# Altium footprint library LUMI_Handy_Soldering_LIB.PcbLib: 562 footprints (part 23 of 36)
Each footprint in its own frame and in the unit in brackets; x right, y up, seen from the top. Pads: shape width x height; smd on the part's side, far side on the other; paste and mask are expansions set on the pad; w line width, h text height; cw(c..) or ccw(c..) is an arc to the next point about the centre after c.
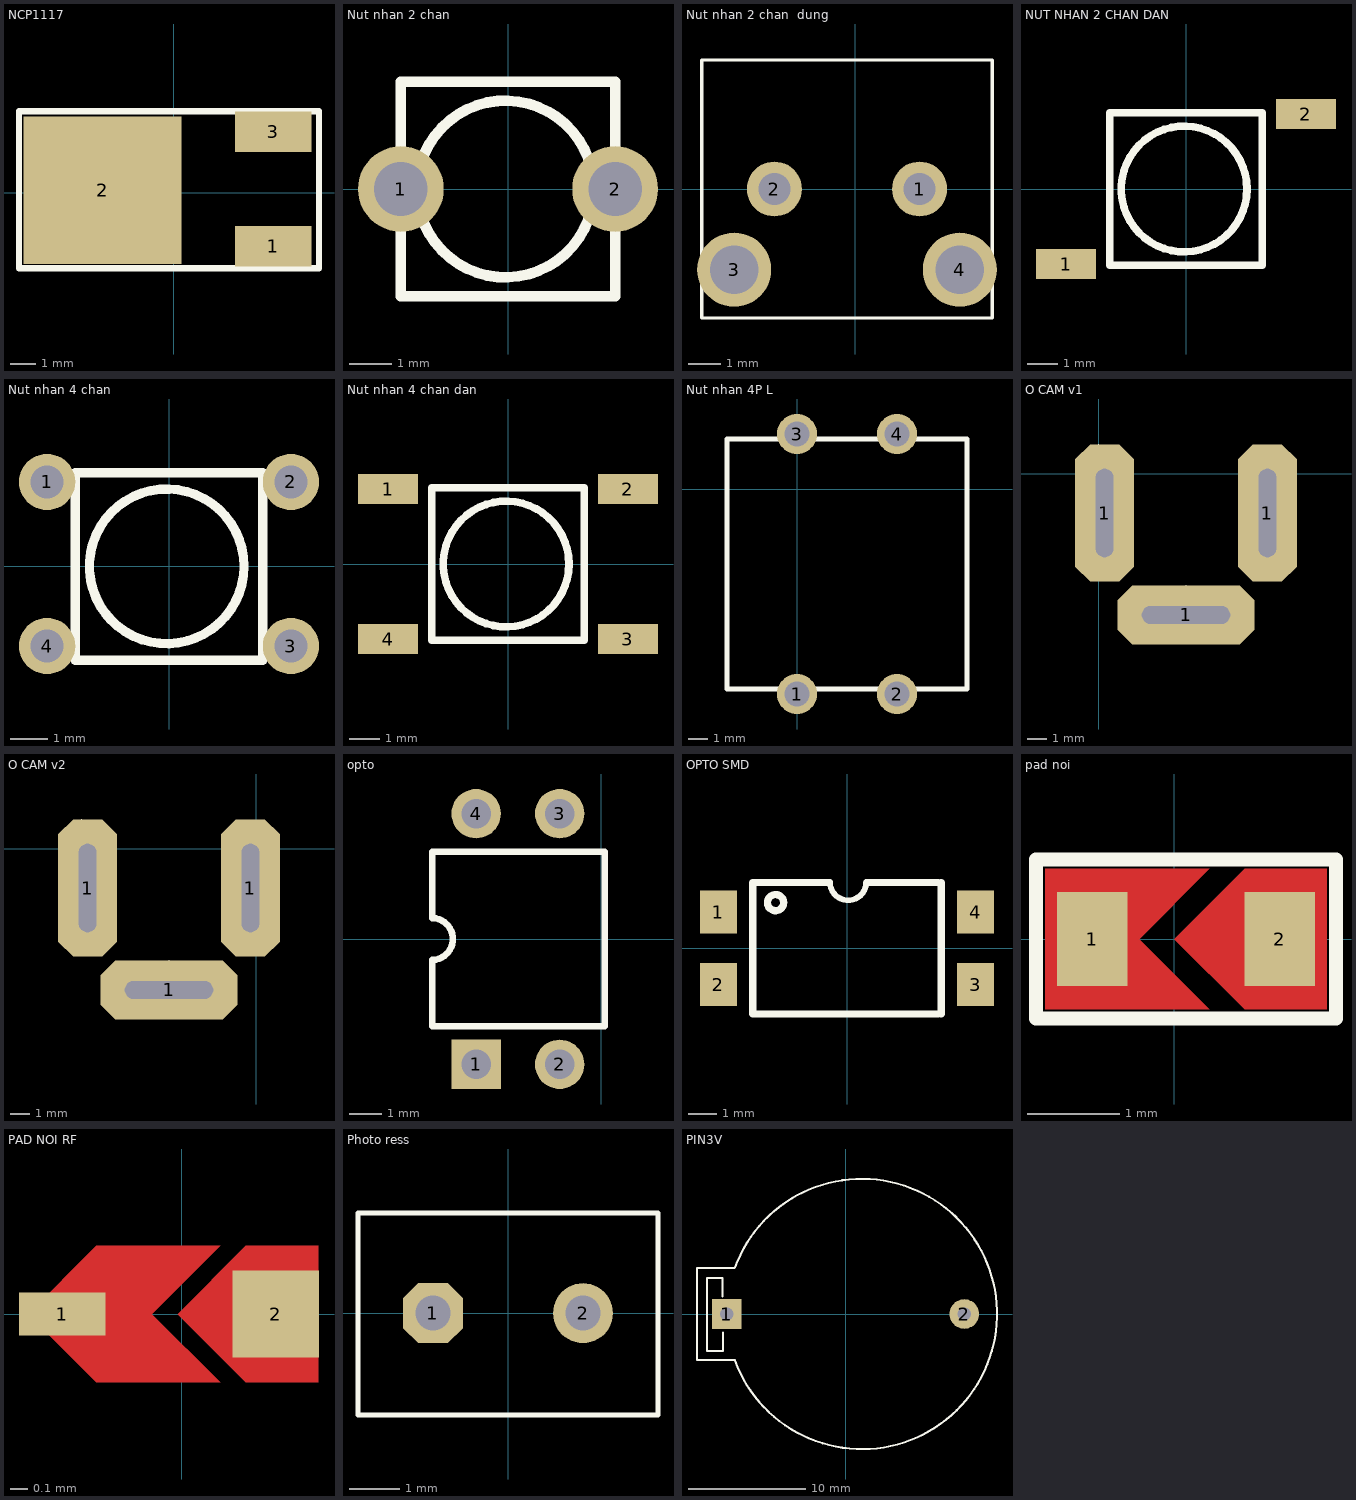
[diagram p22: the footprints below, top view; thin cyan lines are the x and y axes]

## NCP1117 [mm]
pads (3):
  rect 3x1.6 smd: 1(3.9,-2.1) 3(3.9,2.4)
  rect 6.2x5.8 smd: 2(-2.8,0.1)
Top Overlay:
  lines w0.254: -6.08,-2.97 -6.08,3.2 5.7,3.2 5.7,-2.97 -6.08,-2.97
3D body: height 2.3, standoff -0.01, extent -4.75,-3.2 4.95,3.38

## Nut nhan 2 chan [mil]
pads (2):
  round 80 hole 50: 1(-100,0) 2(100,0)
Top Overlay:
  circle w10: c-2.46,0 r82.46
  lines w10: -100,-100 100,-100 100,100 -100,100 -100,-100
3D body: height 216.85, standoff -58.74, extent -137.84,-115.11 131.84,121.11

## Nut nhan 2 chan  dung [mm]
pads (4):
  round 1.7 hole 1: 1(2,0) 2(-2.5,0)
  round 2.3 hole 1.5: 3(-3.75,-2.5) 4(3.25,-2.5)
Top Overlay:
  lines w0.102: -4.75,-4 -4.75,3.5 -4.75,4 4.25,4 4.25,-4 -4.75,-4
3D body: height 7.8, standoff -3.2, extent -4.554,-3.95 4.054,3.9

## NUT NHAN 2 CHAN DAN [mm]
pads (2):
  rect 2x1 smd: 1(-4,-2.5) 2(4,2.5)
Top Overlay:
  circle w0.254: c-0.063,0 r2.095
  lines w0.254: -2.54,-2.54 2.54,-2.54 2.54,2.54 -2.54,2.54 -2.54,-2.54
3D body: height 5.51, standoff -1.49, extent -3.501,-2.924 3.349,3.076

## Nut nhan 4 chan [mil]
pads (4):
  round 60 hole 35: 1(-130,90) 2(130,90) 3(130,-85) 4(-130,-85)
Top Overlay:
  circle w10: c-2.46,0 r82.46
  lines w10: -100,-100 -100,100 100,100 100,-100 -100,-100
3D body: height 216.85, standoff -58.74, extent -137.84,-115.11 131.84,121.11

## Nut nhan 4 chan dan [mm]
pads (4):
  rect 2x1 smd: 1(-4,2.5) 2(4,2.5) 3(4,-2.5) 4(-4,-2.5)
Top Overlay:
  circle w0.254: c-0.063,0 r2.095
  lines w0.254: -2.54,-2.54 -2.54,2.54 2.54,2.54 2.54,-2.54 -2.54,-2.54
3D body: height 5.51, standoff -1.49, extent -3.501,-2.924 3.349,3.076

## Nut nhan 4P L [mil]
pads (4):
  round 80 hole 50: 1(0,-410) 2(200,-410) 3(0,110) 4(200,110)
Top Overlay:
  lines w10: -140,-400 340,-400 340,100 -140,100 -140,-400
3D body: height 478.09, standoff -98.74, extent -140,-426.57 332.44,126.57

## O CAM v1 [mm]
pads (5):
  round 0.254 hole 0.127: 0(4.45,-7.2) 0(8.6,-2)
  oct 3x7 hole 0.9 slot 4.5 at 90 deg: 1(0.3,-2) 1(8.6,-2)
  oct 7x3 hole 0.9 slot 4.5 at 0 deg: 1(4.45,-7.2)
Top Overlay:
  lines w0.025: 0,0 0,1.5 ; 0.3,-4.5 0.3,0.2 ; 4.45,-7.675 4.45,-5.675 ; 4.45,-7.2 6.45,-7.2
  lines w0.051: 0,-4 0,0 ; 0,-4 0.6,-4 ; 0,-4 0,0 ; 0,-4 0.6,-4 ; 0,0 0.6,0 ; 0,0 0.6,0 ; 0.6,-4 0.6,0 ; 0.6,-4 0.6,0 ; 2.45,-7.5 6.45,-7.5 ; 2.45,-7.5 2.45,-6.9 ; 2.45,-7.5 6.45,-7.5 ; 2.45,-7.5 2.45,-6.9 ; 2.45,-7.5 6.45,-7.5 ; 2.45,-6.9 6.45,-6.9 ; 2.45,-6.9 6.45,-6.9 ; 6.45,-7.5 6.45,-6.9 ; 6.45,-7.5 6.45,-6.9 ; 8.3,-4 8.3,0 ; 8.3,-4 8.9,-4 ; 8.3,-4 8.3,0 ; 8.3,-4 8.9,-4 ; 8.3,0 8.9,0 ; 8.3,0 8.9,0 ; 8.9,-4 8.9,0 ; 8.9,-4 8.9,0
3D body: height 15.59, standoff -2.5, extent -0.047,-7.5 8.897,0.972

## O CAM v2 [mm]
pads (5):
  round 0.254 hole 0.127: 0(-4.45,-7.2) 0(-0.3,-2)
  oct 3x7 hole 0.9 slot 4.5 at 90 deg: 1(-8.6,-2) 1(-0.3,-2)
  oct 7x3 hole 0.9 slot 4.5 at 0 deg: 1(-4.45,-7.2)
Top Overlay:
  lines w0.025: -8.9,0 -8.9,1.5 ; -8.6,-4.5 -8.6,0.2 ; -4.45,-7.675 -4.45,-5.675 ; -4.45,-7.2 -2.45,-7.2
  lines w0.051: -8.9,-4 -8.3,-4 ; -8.9,-4 -8.9,0 ; -8.9,-4 -8.3,-4 ; -8.9,-4 -8.9,0 ; -8.9,0 -8.3,0 ; -8.9,0 -8.3,0 ; -8.3,-4 -8.3,0 ; -8.3,-4 -8.3,0 ; -6.45,-7.5 -2.45,-7.5 ; -6.45,-7.5 -6.45,-6.9 ; -6.45,-7.5 -2.45,-7.5 ; -6.45,-7.5 -6.45,-6.9 ; -6.45,-7.5 -2.45,-7.5 ; -6.45,-6.9 -2.45,-6.9 ; -6.45,-6.9 -2.45,-6.9 ; -2.45,-7.5 -2.45,-6.9 ; -2.45,-7.5 -2.45,-6.9 ; -0.6,-4 0,-4 ; -0.6,-4 -0.6,0 ; -0.6,-4 0,-4 ; -0.6,-4 -0.6,0 ; -0.6,0 0,0 ; -0.6,0 0,0 ; 0,-4 0,0 ; 0,-4 0,0
3D body: height 15.59, standoff -2.5, extent -8.947,-7.5 -0.003,0.972

## opto [mm] "DIP; 8 Leads; Row Spacing 7.62 mm; Pitch 2.54 mm"
height 5.08
pads (4):
  rect 1.5x1.5 hole 0.9: 1(-3.81,-3.81)
  round 1.5 hole 0.9: 2(-1.27,-3.81) 3(-1.27,3.81) 4(-3.81,3.81)
Top Overlay:
  lines w0.2: -5.15,-2.65 -5.15,-0.635 ccw(c-5.15,0) -5.15,0.635 -5.15,2.65 0.102,2.65 0.102,-2.65 -5.15,-2.65
3D body: height 3.81, standoff -5.37, extent -4.955,-6.551 -0.125,6.551

## OPTO SMD [mm] "DIP; 8 Leads; Row Spacing 7.62 mm; Pitch 2.54 mm"
height 5.08
pads (4):
  rect 1.3x1.5 smd: 1(-4.5,1.27) 2(-4.5,-1.27) 3(4.5,-1.27) 4(4.5,1.27)
Top Overlay:
  circle w0.254: c-2.5,1.6 r0.283
  lines w0.2: -0.596,2.318 ccw(c0.039,2.318) 0.674,2.318
  lines w0.254: -0.614,2.3 -3.3,2.3 -3.3,-2.3 3.2,-2.3 ; 0.692,2.3 3.2,2.3 ; 3.3,-2.3 3.3,2.3
3D body: height 2.02, standoff 0, extent -3.5,-1.3 3.5,1.4

## pad noi [mil]
pads (2):
  rect 30x40 smd: 1(-35,0) 2(45,0)
Top Layer:
  region: -55,30 15,30 -15,0 15,-30 -55,-30
  region: 30,30 0,0 30,-30 65,-30 65,30
Top Overlay:
  lines w6: -59,-34 69,-34 69,34 -59,34 -59,-34
Top Solder:
  region: 30,30 0,0 30,-30 65,-30 65,30
  region: -55,30 15,30 -15,0 15,-30 -55,-30

## PAD NOI RF [mil]
pads (2):
  rect 20x10 smd: 1(-27.56,0)
  rect 20x20 smd: 2(21.65,0)
Top Layer:
  region: -19.68,15.75 8.86,15.75 -6.89,0 8.86,-15.75 -19.68,-15.75 -35.43,0
  region: 14.76,15.75 -0.98,0 14.76,-15.75 31.5,-15.75 31.5,15.75
Top Solder:
  region: 15.75,15.75 0,0 15.75,-15.75 31.5,-15.75 31.5,15.75
  region: -35.43,15.75 15.75,15.75 0,0 15.75,-15.75 -35.43,-15.75

## PCBComponent_1 [mm]

## Photo ress [mm]
pads (2):
  oct 1.2x1.2 hole 0.7: 1(-1.5,0)
  round 1.2 hole 0.7: 2(1.5,0)
Top Overlay:
  lines w0.1: -3,-2.032 3,-2.032 3,2 -3,2 -3,-2.032
3D body: height 2.25, standoff -35.59, extent -2.311,-1.911 2.311,2

## PIN3V [mil]
pads (2):
  rect 100x100 hole 45: 1(-400,0)
  round 100 hole 45: 2(400,0)
Top Overlay:
  lines w7: -414,59 -414,121 -466,121 -466,-124 -413,-124 -413,-63 ; -373.67,155 -500,155 -500,-155 -372.07,-155 ; -372.4,156.07 cw(c55,0) -372.07,-156.96
3D body: height 278.16, standoff -137.2, extent -528.08,-446.83 601.84,448.84